# Altium footprint library 7-Pcblib_Power.PcbLib: 31 footprints (part 2 of 2)
Each footprint in its own frame and in the unit in brackets; x right, y up, seen from the top. Pads: shape width x height; smd on the part's side, far side on the other; paste and mask are expansions set on the pad; w line width, h text height; cw(c..) or ccw(c..) is an arc to the next point about the centre after c.
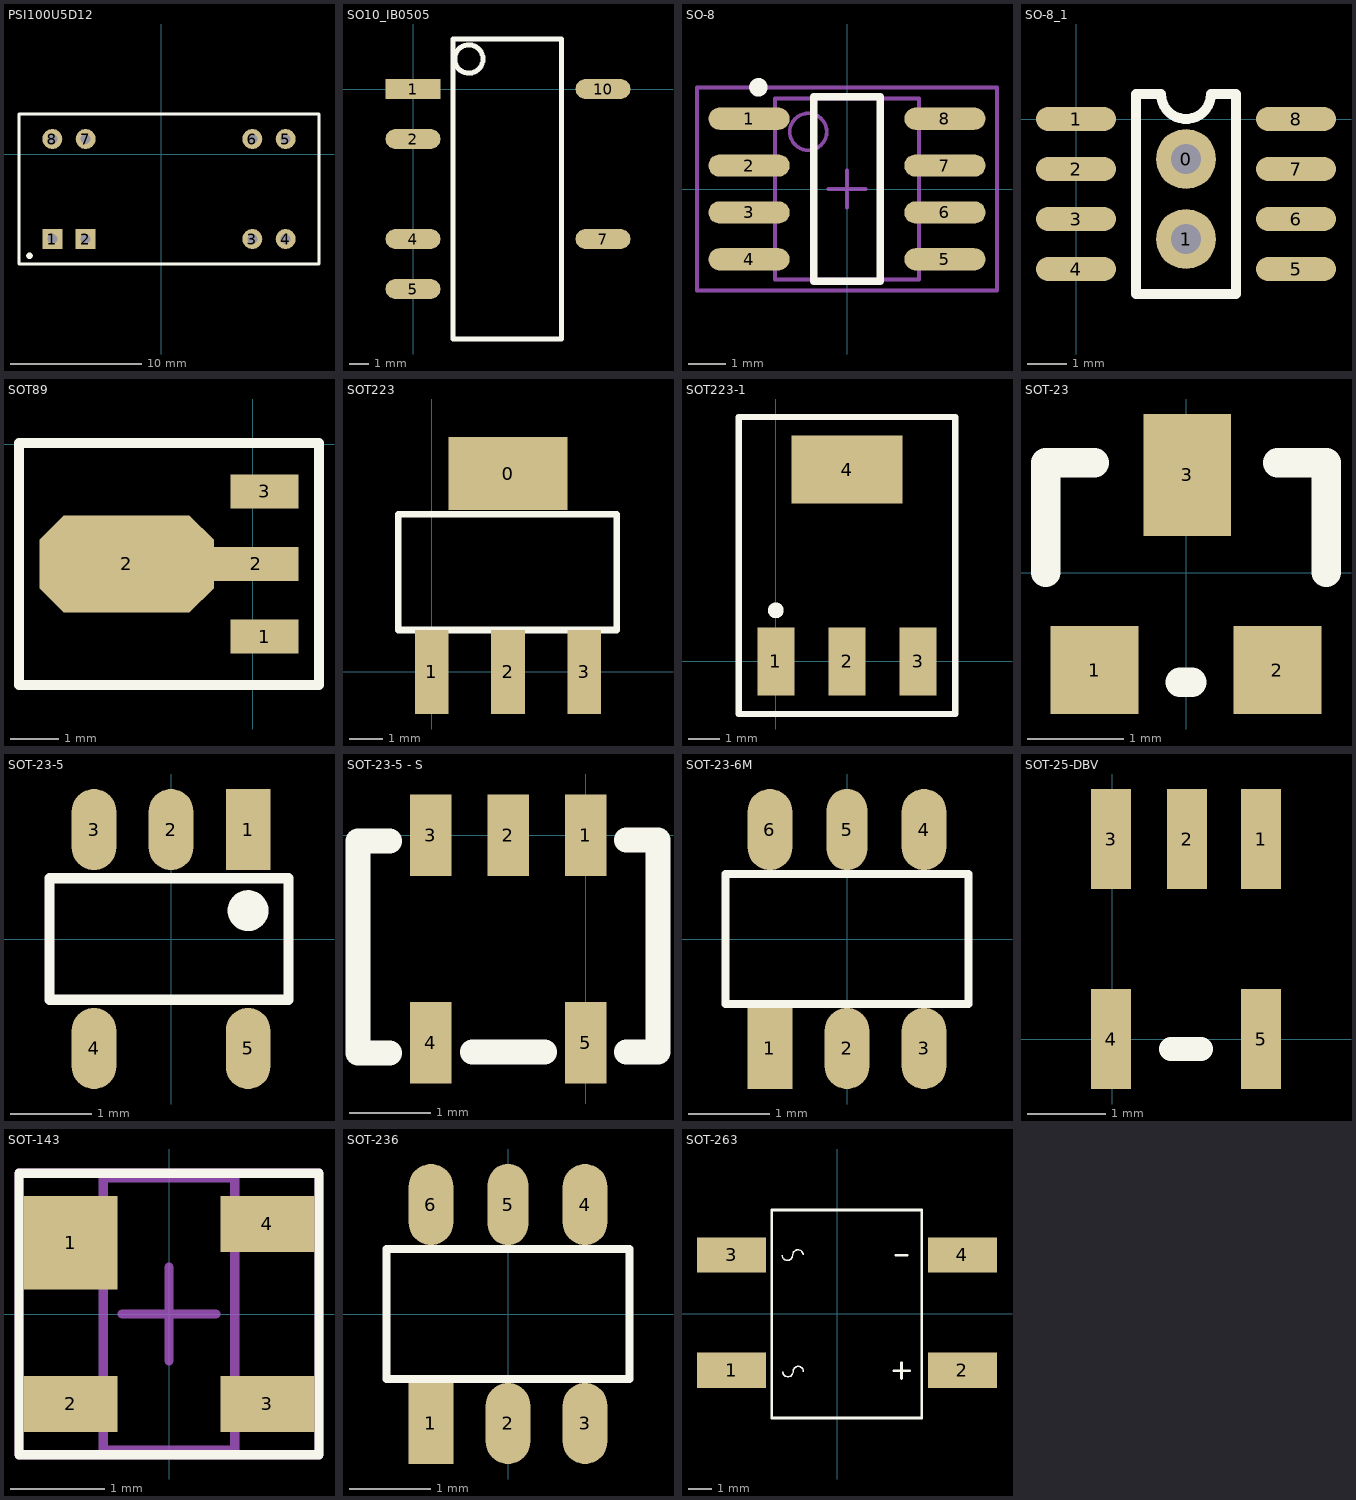
[diagram p1: the footprints below, top view; thin cyan lines are the x and y axes]

## PSI100U5D12 [mil]
pads (8):
  rect 60x60 hole 30: 1(-326.46,-254.66) 2(-226.46,-254.66)
  round 60 hole 30: 3(273.54,-254.66) 4(373.54,-254.66) 5(373.54,45.34) 6(273.54,45.34) 7(-226.46,45.34) 8(-326.46,45.34)
Top Overlay:
  circle w9.84: c-394.92,-305 r4.92
  lines w10: -426.46,-329.66 -426.46,-304.66 -426.46,120.34 473.54,120.34 473.54,-329.66 -426.46,-329.66

## SO10_IB0505 [mm]
pads (6):
  rect 2.8x1 smd: 1(0,0)
  oval 2.8x1 smd: 2(0,-2.54) 4(0,-7.62) 5(0,-10.16) 7(9.652,-7.62) 10(9.652,0)
Top Overlay:
  circle w0.254: c2.838,1.524 r0.718
  lines w0.254: 2.032,-12.7 7.532,-12.7 7.532,2.54 2.032,2.54 2.032,-12.7

## SO-8 [mm] "SOIC"
height 1.75
pads (8):
  oval 2.2x0.6 smd: 1(-2.654,1.905) 2(-2.654,0.635) 3(-2.654,-0.635) 4(-2.654,-1.905) 5(2.654,-1.905) 6(2.654,-0.635) 7(2.654,0.635) 8(2.654,1.905)
Top Overlay:
  circle w0.25: c-2.4,2.755 r0.125
  lines w0.2: -0.9,-2.5 0.9,-2.5 0.9,2.5 -0.9,2.5 -0.9,-2.5
Mechanical 13:
  circle w0.1: c-1.05,1.55 r0.5
  lines w0.1: -1.95,-2.45 1.95,-2.45 1.95,2.45 -1.95,2.45 -1.95,-2.45
Mechanical 15:
  lines w0.1: -0.5,0 0.5,0 ; 0,-0.5 0,0.5 ; -4.064,-2.75 4.064,-2.75 4.064,2.75 -4.064,2.75 -4.064,-2.75
3D body: height 1.7, standoff 0, extent -3,-2.413 3,2.487

## SO-8_1 [mil]
pads (10):
  round 60 hole 30: 0(110,-40) 1(110,-120)
  oval 80x24 smd: 1(0,0) 2(0,-50) 3(0,-100) 4(0,-150) 5(220,-150) 6(220,-100) 7(220,-50) 8(220,0)
Top Overlay:
  lines w10: 60,-175 160,-175 160,25 135,25 cw(c110,25) 85,25 60,25 60,-175
Top Paste:
  rectangle: 70,-155 150,-5
Bottom Paste:
  rectangle: 70,-155 150,-5
Top Solder:
  rectangle: 70,-155 150,-5
Bottom Solder:
  rectangle: 70,-155 150,-5

## SOT89 [mm]
pads (4):
  rect 1.4x0.7 smd: 1(0.24,-3.97) 3(0.24,-0.97)
  oct 3.6x2 smd: 2(-2.61,-2.47)
  rect 1.75x0.7 smd: 2(0.065,-2.47)
Top Overlay:
  lines w0.2: -4.835,-4.97 -4.835,0.03 1.365,0.03 1.365,-4.97 -4.835,-4.97
3D body: height -0.38, standoff -1.89, extent -3.556,-4.739 0.744,-0.239

## SOT223 [mm]
height 0.6
pads (4):
  rect 3.6x2.2 smd: 0(2.3,6)
  rect 1.016x2.54 smd: 1(0,0) 2(2.3,0) 3(4.6,0)
Top Overlay:
  lines w0.203: -1.016,1.27 -1.016,4.772 5.588,4.772 5.588,1.27 -1.016,1.27
3D body: height 1.85, standoff -0.01, extent -0.953,-0.502 5.547,6.497

## SOT223-1 [mm]
pads (4):
  rect 1.2x2.2 smd: 1(0,0) 2(2.3,0) 3(4.6,0)
  rect 3.6x2.2 smd: 4(2.3,6.2)
Top Overlay:
  circle w0.254: c0,1.651 r0.127
  lines w0.2: -1.2,-1.7 -1.2,7.9 5.8,7.9 5.8,-1.7 -1.2,-1.7
3D body: height -0.38, standoff -2.08, extent -0.964,-0.178 5.536,6.782

## SOT-23 [mil]
height 47.24
pads (3):
  rect 36x36 smd: 1(-37.5,-40) 2(37.5,-40)
  rect 36x50 smd: 3(0.5,40)
Top Overlay:
  lines w12: -57.5,0 -57.5,45 -37.5,45 ; -2.5,-45 2.5,-45 ; 37.5,45 57.5,45 57.5,0
3D body: height -15, standoff -62.24, extent -54.08,-52.11 60.09,58.12

## SOT-23-5 [mm]
pads (5):
  rect 0.55x1 smd: 1(0.95,1.35)
  oval 0.55x1 smd: 2(0,1.35) 3(-0.95,1.35) 4(-0.95,-1.35) 5(0.95,-1.35)
Top Overlay:
  circle w0.254: c0.95,0.35 r0.125
  lines w0.127: -1.05,0.75 1.45,0.75 1.45,-0.75 -1.5,-0.75 -1.5,0.75 -1,0.75
3D body: height -0.38, standoff -1.58, extent -1.45,-1.4 1.45,1.4

## SOT-23-5 - S [mm]
pads (5):
  rect 0.508x1 smd: 1(0,0) 2(-0.95,0) 3(-1.9,0) 4(-1.9,-2.54) 5(0,-2.54)
Top Overlay:
  lines w0.305: -2.403,-2.667 -2.791,-2.667 -2.791,-0.067 -2.403,-0.067 ; -1.391,-2.656 -0.503,-2.656 ; 0.497,-2.656 0.886,-2.656 0.886,-0.056 0.497,-0.056
3D body: height 1.45, standoff 0, extent -2.39,-2.759 0.51,0.041

## SOT-23-6M [mm]
pads (6):
  rect 0.55x1 smd: 1(-0.95,-1.35)
  oval 0.55x1 smd: 2(0,-1.35) 3(0.95,-1.35) 4(0.95,1.35) 6(-0.95,1.35)
  oval 0.5x1 smd: 5(0,1.35)
Top Overlay:
  lines w0.1: -1.5,-0.8 -1.5,0.8 1.5,0.8 1.5,-0.8 -1.5,-0.8
3D body: height 0.86, standoff 0, extent -1.5,-1.405 1.5,1.405

## SOT-25-DBV [mil]
height 47.24
pads (5):
  rect 20x50 smd: 1(74.37,100.21) 2(37.37,100.21) 3(-0.63,100.21) 4(-0.63,0.21) 5(74.37,0.21)
Top Overlay:
  lines w12: 29.37,-4.79 44.37,-4.79
3D body: height -62.99, standoff -110.24, extent -20.09,-6.12 94.09,104.12

## SOT-143 [mm] "SOT143, 4-Leads, Body 3.0x2.6mm (max), Pitch 1.92mm, IPC Medium Density"
height 1.2
pads (4):
  rect 1x1 smd: 1(-1.05,0.76)
  rect 1x0.6 smd: 2(-1.05,-0.96) 3(1.05,-0.96) 4(1.05,0.96)
Top Overlay:
  lines w0.1: -1.6,-1.5 -1.6,1.5 1.6,1.5 1.6,-1.5 -1.6,-1.5
Mechanical 13:
  lines w0.1: -0.7,-1.45 -0.7,1.45 0.7,1.45 0.7,-1.45 -0.7,-1.45
Mechanical 15:
  lines w0.1: -0.5,0 0.5,0 ; 0,-0.5 0,0.5 ; -1.6,-1.5 1.6,-1.5 1.6,1.5 -1.6,1.5 -1.6,-1.5
3D body: height 1.2, standoff 0.15, extent -0.7,-1.52 0.7,1.52

## SOT-236 [mm]
pads (6):
  rect 0.55x1 smd: 1(-0.95,-1.35)
  oval 0.55x1 smd: 2(0,-1.35) 3(0.95,-1.35) 4(0.95,1.35) 6(-0.95,1.35)
  oval 0.5x1 smd: 5(0,1.35)
Top Overlay:
  lines w0.1: -1.5,-0.8 1.5,-0.8 1.5,0.8 -1.5,0.8 -1.5,-0.8
3D body: height 1.09, standoff 0, extent -1.422,-1.187 1.372,1.238

## SOT-263 [mm]
pads (4):
  rect 3x1.524 smd: 1(-4.572,-2.46) 2(5.428,-2.46) 3(-4.572,2.54) 4(5.428,2.54)
Top Overlay:
  lines w0.06: -2.38,2.522 ccw(c-2.156,2.525) -1.931,2.525 ; -2.357,-2.518 ccw(c-2.132,-2.515) -1.908,-2.515 cw(c-1.683,-2.515) -1.459,-2.511 ; -1.923,2.539 cw(c-1.699,2.539) -1.474,2.542
  lines w0.12: -2.832,-4.523 3.668,-4.523 3.668,4.477 ; -2.832,-4.516 -2.832,4.484 3.668,4.484 ; 2.451,-2.475 3.139,-2.475 ; 2.557,2.525 3.033,2.525 ; 2.795,-2.819 2.795,-2.131